# Altium footprint library hallglib.PcbLib: 92 footprints (part 6 of 6)
Each footprint in its own frame and in the unit in brackets; x right, y up, seen from the top. Pads: shape width x height; smd on the part's side, far side on the other; paste and mask are expansions set on the pad; w line width, h text height; cw(c..) or ccw(c..) is an arc to the next point about the centre after c.
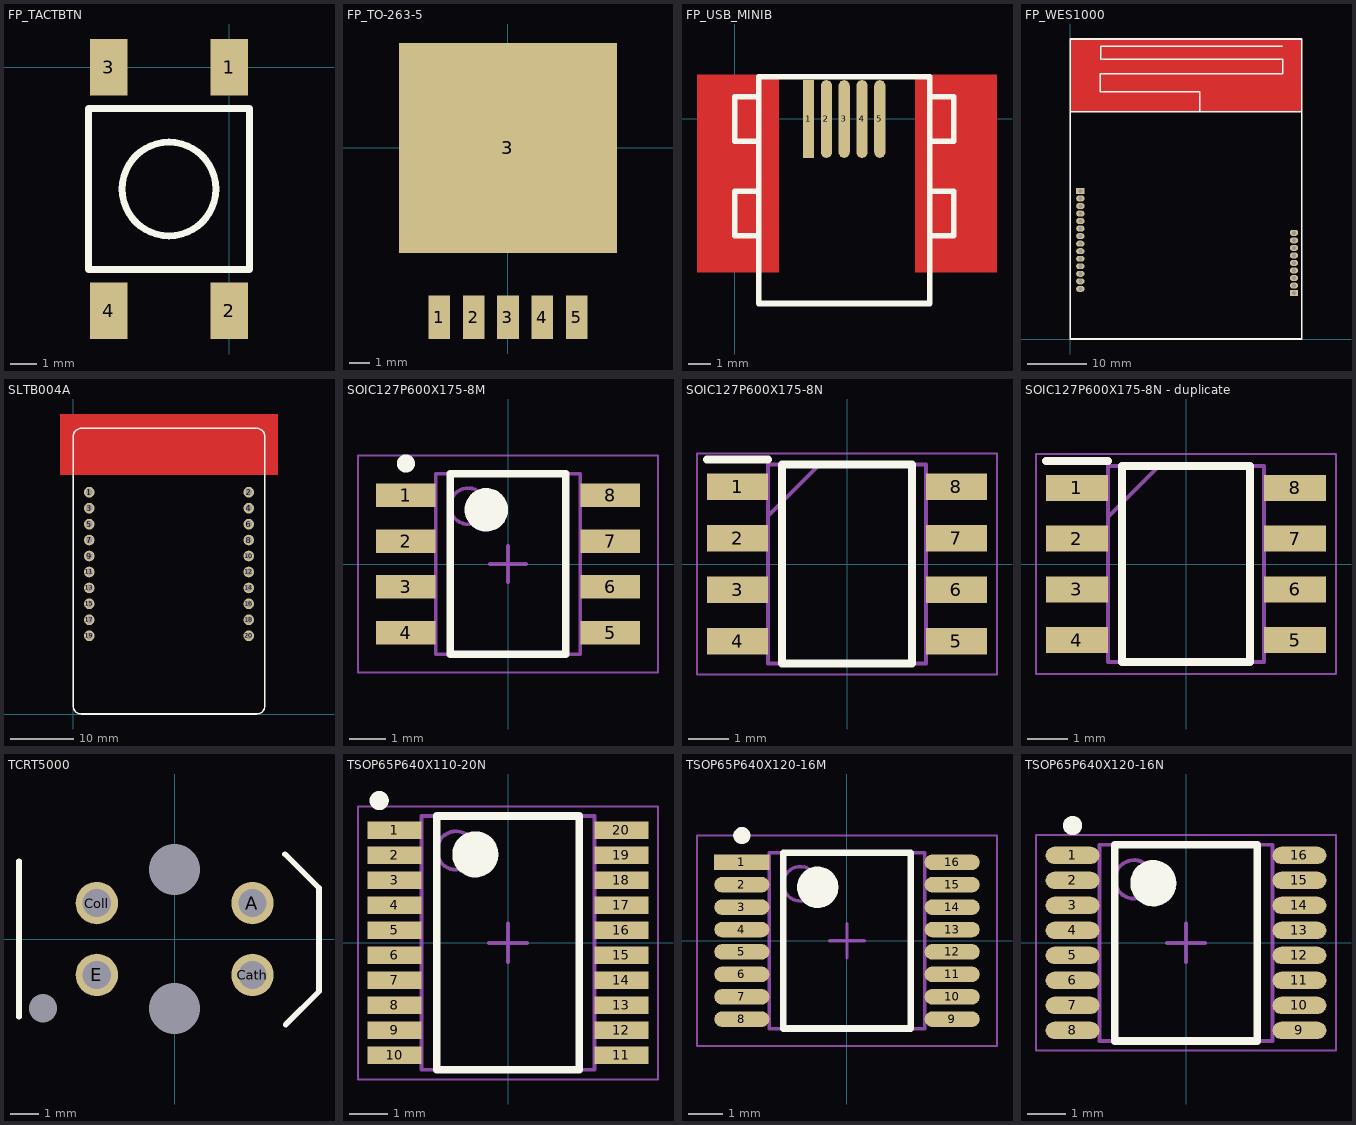
[diagram p5: the footprints below, top view; thin cyan lines are the x and y axes]

## FP_TACTBTN [mm] "TE CONNECTIVITY / ALCOSWITCH - FSM2JSMA"
height 4.44
pads (4):
  rect 1.4x2.1 smd: 1(0,0) 2(0,-9.1) 3(-4.5,0) 4(-4.5,-9.1)
Top Overlay:
  circle w0.254: c-2.25,-4.55 r1.75
  lines w0.254: -5.25,-7.55 0.75,-7.55 0.75,-1.55 -5.25,-1.55 -5.25,-7.55
3D body "TACT_SMD_6X6.STEP": height 5, standoff -0.05, extent -5.225,-8.575 0.775,-0.425

## FP_TO-263-5 [mm] "TO-263-5 footprint"
height 4.5
pads (6):
  rect 1.07x2.16 smd: 1(-3.4,-8.4) 2(-1.7,-8.4) 3(0,-8.4) 4(1.7,-8.4) 5(3.4,-8.4)
  rect 10.8x10.41 smd: 3(0,0)
3D body "TO-263-5.STEP": height 4.56, standoff 0, extent -5.08,-9.327 5.08,4.687

## FP_USB_MINIB [mm] "MINI USB csatlakozó"
height 3.9
pads (5):
  rect 0.5x3.5 smd: 1(3.325,0)
  oval 0.5x3.5 smd: 2(4.125,0) 3(4.925,0) 4(5.725,0) 5(6.525,0)
Top Layer:
  rectangle: 8.1,-6.9 11.8,2
  rectangle: -1.7,-6.9 2,2
Top Overlay:
  lines w0.254: 1.075,-5.25 0,-5.25 0,-3.25 1.075,-3.25 ; 1.075,-1 0,-1 0,1 1.075,1 ; 8.775,-5.25 9.85,-5.25 9.85,-3.25 8.775,-3.25 ; 8.775,-1 9.85,-1 9.85,1 8.775,1 ; 1.075,-8.3 8.775,-8.3 8.775,1.9 1.075,1.9 1.075,-8.3
Top Solder:
  rectangle: 8.8,-5.95 10.8,-2.45
  rectangle: 8.8,-1.75 10.8,1.75
  rectangle: -1,-6.05 1,-2.55
  rectangle: -1,-1.75 1,1.75
3D body "USBBMINI.STEP": height 4, standoff -0.05, extent 0.003,-8.335 9.903,0.665

## FP_WES1000 [mm]
height 2
pads (23):
  rect 1.4x1 hole 0.7 mask+0.1: 1(1.676,24.968) 15(37.719,7.747)
  oval 1.4x1 hole 0.7 mask+0.1: 2(1.676,23.698) 3(1.676,22.428) 4(1.676,21.158) 5(1.676,19.888) 6(1.676,18.618) 7(1.676,17.348) 8(1.676,16.078) 9(1.676,14.808) 10(1.676,13.538) 11(1.676,12.268) 12(1.676,10.998) 13(1.676,9.728) 14(1.676,8.458) 16(37.719,9.017) 17(37.719,10.287) 18(37.719,11.557) 19(37.719,12.827) 20(37.719,14.097) 21(37.719,15.367) 22(37.719,16.637) 23(37.719,17.907)
Top Layer:
  pour cut-out: 0,38.3 0,50.6 39,50.6 39,38.3
Bottom Layer:
  pour cut-out: 0,38.3 0,50.6 39,50.6 39,38.3
Top Overlay:
  lines w0.254: 0,38.3 39,38.3 ; 21.8,38.3 21.8,41.7 5,41.7 5,44.7 35.8,44.7 35.8,47.2 5.1,47.2 5.1,49.4 35.7,49.4 ; 0,0 39,0 39,50.6 0,50.6 0,0
Bottom Overlay:
  lines w0.2: 0.576,7.768 0.576,25.758 ; 2.776,7.768 2.776,25.758 ; 36.619,6.957 36.619,18.447 ; 38.819,6.957 38.819,18.447
3D body: height 2, standoff 0, extent -0.127,-0.127 39.127,50.727

## SLTB004A [mm] "Thunderboard Sense 2 module"
pads (20):
  round 1.7 hole 1.1: 1(2.54,35.306) 2(27.94,35.306) 3(2.54,32.766) 4(27.94,32.766) 5(2.54,30.226) 6(27.94,30.226) 7(2.54,27.686) 8(27.94,27.686) 9(2.54,25.146) 10(27.94,25.146) 11(2.54,22.606) 12(27.94,22.606) 13(2.54,20.066) 14(27.94,20.066) 15(2.54,17.526) 16(27.94,17.526) 17(2.54,14.986) 18(27.94,14.986) 19(2.54,12.446) 20(27.94,12.446)
Top Layer:
  pour cut-out: -2.032,38.1 -2.032,47.752 32.512,47.752 32.512,38.1
Bottom Layer:
  pour cut-out: -2.032,38.1 -2.032,47.752 32.512,47.752 32.512,38.1
Top Overlay:
  lines w0.254: 0,1.27 ccw(c1.27,1.27) 1.27,0 29.21,0 ccw(c29.21,1.27) 30.48,1.27 30.48,44.196 ccw(c29.21,44.196) 29.21,45.466 1.27,45.466 ccw(c1.27,44.196) 0,44.196 0,1.27
3D body: height 8.7, standoff 8.4, extent 0,0 30.5,45.5
3D body: height 8.4, standoff 0, extent 26.675,11.3 29.175,36.5
3D body: height 8.4, standoff 0, extent 1.275,11.3 3.775,36.5
3D body: height 0, standoff -3, extent 27.61,14.656 28.27,15.316
3D body: height 0, standoff -3, extent 27.61,12.116 28.27,12.776
3D body: height 0, standoff -3, extent 27.61,19.736 28.27,20.396
3D body: height 0, standoff -3, extent 27.61,17.196 28.27,17.856
3D body: height 0, standoff -3, extent 27.61,24.816 28.27,25.476
3D body: height 0, standoff -3, extent 27.61,22.276 28.27,22.936
3D body: height 0, standoff -3, extent 27.61,29.896 28.27,30.556
3D body: height 0, standoff -3, extent 27.61,27.356 28.27,28.016
3D body: height 0, standoff -3, extent 27.61,34.976 28.27,35.636
3D body: height 0, standoff -3, extent 27.61,32.436 28.27,33.096
3D body: height 0, standoff -3, extent 2.21,34.976 2.87,35.636
3D body: height 0, standoff -3, extent 2.21,32.436 2.87,33.096
3D body: height 0, standoff -3, extent 2.21,29.896 2.87,30.556
3D body: height 0, standoff -3, extent 2.21,27.356 2.87,28.016
3D body: height 0, standoff -3, extent 2.21,24.816 2.87,25.476
3D body: height 0, standoff -3, extent 2.21,22.276 2.87,22.936
3D body: height 0, standoff -3, extent 2.21,19.736 2.87,20.396
3D body: height 0, standoff -3, extent 2.21,17.196 2.87,17.856
3D body: height 0, standoff -3, extent 2.21,14.656 2.87,15.316
3D body: height 0, standoff -3, extent 2.21,12.116 2.87,12.776

## SOIC127P600X175-8M [mm] "SOIC, 8-Leads, Body 4,90x3,90mm, Pitch 1,27mm, IPC Low Density"
height 1.75
pads (8):
  rect 1.65x0.65 smd: 1(-2.825,1.905) 2(-2.825,0.635) 3(-2.825,-0.635) 4(-2.825,-1.905) 5(2.825,-1.905) 6(2.825,-0.635) 7(2.825,0.635) 8(2.825,1.905)
Top Overlay:
  circle w0.6: c-0.6,1.5 r0.3
  circle w0.25: c-2.825,2.78 r0.125
  lines w0.2: -1.6,-2.5 1.6,-2.5 1.6,2.5 -1.6,2.5 -1.6,-2.5
Mechanical 13:
  circle w0.1: c-1.1,1.6 r0.5
  lines w0.1: -2,-2.5 2,-2.5 2,2.5 -2,2.5 -2,-2.5
Mechanical 15:
  lines w0.05: -4.15,-3 4.15,-3 4.15,3 -4.15,3 -4.15,-3
  lines w0.1: -0.5,0 0.5,0 ; 0,-0.5 0,0.5
3D body "SOIC127P600X175-8M.step": height 1.75, standoff 0, extent -3,-2.5 3,2.5

## SOIC127P600X175-8N [mm]
pads (8):
  rect 1.5x0.65 smd: 1(-2.7,1.905) 2(-2.7,0.635) 3(-2.7,-0.635) 4(-2.7,-1.905) 5(2.7,-1.905) 6(2.7,-0.635) 7(2.7,0.635) 8(2.7,1.905)
Top Overlay:
  lines w0.2: -3.45,2.58 -1.95,2.58 ; -1.6,-2.45 1.6,-2.45 1.6,2.45 -1.6,2.45 -1.6,-2.45
Mechanical 15:
  lines w0.1: -1.95,1.18 -0.68,2.45 ; -1.95,-2.45 1.95,-2.45 1.95,2.45 -1.95,2.45 -1.95,-2.45
Bottom Assembly:
  lines w0.05: -3.7,-2.725 3.7,-2.725 3.7,2.725 -3.7,2.725 -3.7,-2.725

## SOIC127P600X175-8N - duplicate [mm]
pads (8):
  rect 1.55x0.65 smd: 1(-2.725,1.905) 2(-2.725,0.635) 3(-2.725,-0.635) 4(-2.725,-1.905) 5(2.725,-1.905) 6(2.725,-0.635) 7(2.725,0.635) 8(2.725,1.905)
Top Overlay:
  lines w0.2: -3.5,2.58 -1.95,2.58 ; -1.6,-2.45 1.6,-2.45 1.6,2.45 -1.6,2.45 -1.6,-2.45
Mechanical 15:
  lines w0.1: -1.95,1.18 -0.68,2.45 ; -1.95,-2.45 1.95,-2.45 1.95,2.45 -1.95,2.45 -1.95,-2.45
Bottom Assembly:
  lines w0.05: -3.75,-2.75 3.75,-2.75 3.75,2.75 -3.75,2.75 -3.75,-2.75

## TCRT5000 [mm]
pads (7):
  round 0 hole 1 unplated: 0(-4.65,-2.45)
  round 0 hole 1.8 unplated: 0(0,-2.45) 0(0,2.45)
  round 1.5 hole 1: A(2.75,1.27) Cath(2.75,-1.27) Coll(-2.75,1.27) E(-2.75,-1.27)
Top Overlay:
  lines w0.2: -5.5,-2.75 -5.5,2.75 ; 3.9,3 5.1,1.8 5.1,-1.85 3.925,-3.025
3D body "80154_TCRT5000_3D_Models.stp": height 7.01, standoff -3.07, extent -5.08,-3.454 5.12,3.454

## TSOP65P640X110-20N [mm] "TSOP, 20-Leads, Body 6,50x4,40mm, Pitch 0,65mm, IPC Medium Density"
height 1.1
pads (20):
  rect 1.4x0.45 smd: 1(-2.95,2.925) 2(-2.95,2.275) 3(-2.95,1.625) 4(-2.95,0.975) 5(-2.95,0.325) 6(-2.95,-0.325) 7(-2.95,-0.975) 8(-2.95,-1.625) 9(-2.95,-2.275) 10(-2.95,-2.925) 11(2.95,-2.925) 12(2.95,-2.275) 13(2.95,-1.625) 14(2.95,-0.975) 15(2.95,-0.325) 16(2.95,0.325) 17(2.95,0.975) 18(2.95,1.625) 19(2.95,2.275) 20(2.95,2.925)
Top Overlay:
  circle w0.25: c-3.35,3.7 r0.125
  circle w0.6: c-0.85,2.3 r0.3
  lines w0.2: -1.85,-3.3 -1.85,3.3 1.85,3.3 1.85,-3.3 -1.85,-3.3
Mechanical 13:
  circle w0.1: c-1.35,2.4 r0.5
  lines w0.1: -2.25,-3.3 -2.25,3.3 2.25,3.3 2.25,-3.3 -2.25,-3.3
Mechanical 15:
  lines w0.05: -3.9,-3.55 -3.9,3.55 3.9,3.55 3.9,-3.55 -3.9,-3.55
  lines w0.1: -0.5,0 0.5,0 ; 0,-0.5 0,0.5
3D body "TSOP65P640X110-20N.step": height 1.1, standoff 0, extent -3.2,-3.3 3.2,3.3

## TSOP65P640X120-16M [mm] "TSOP, 16-Leads, Body 5,00x4,40mm, Pitch 0,65mm, IPC Low Density"
height 1.2
pads (16):
  rect 1.6x0.45 smd: 1(-3.05,2.275)
  oval 1.6x0.45 smd: 2(-3.05,1.625) 3(-3.05,0.975) 4(-3.05,0.325) 5(-3.05,-0.325) 6(-3.05,-0.975) 7(-3.05,-1.625) 8(-3.05,-2.275) 9(3.05,-2.275) 10(3.05,-1.625) 11(3.05,-0.975) 12(3.05,-0.325) 13(3.05,0.325) 14(3.05,0.975) 15(3.05,1.625) 16(3.05,2.275)
Top Overlay:
  circle w0.6: c-0.85,1.55 r0.3
  circle w0.25: c-3.05,3.05 r0.125
  lines w0.2: -1.85,-2.55 1.85,-2.55 1.85,2.55 -1.85,2.55 -1.85,-2.55
Mechanical 13:
  circle w0.1: c-1.35,1.65 r0.5
  lines w0.1: -2.25,-2.55 2.25,-2.55 2.25,2.55 -2.25,2.55 -2.25,-2.55
Mechanical 15:
  lines w0.05: -4.35,-3.05 4.35,-3.05 4.35,3.05 -4.35,3.05 -4.35,-3.05
  lines w0.1: -0.5,0 0.5,0 ; 0,-0.5 0,0.5
3D body: height 1.2, standoff 0.15, extent -2.25,-2.55 2.25,2.55

## TSOP65P640X120-16N [mm] "TSOP, 16-Leads, Body 5,00x4,40mm, Pitch 0,65mm, IPC Medium Density"
height 1.2
pads (16):
  oval 1.4x0.45 smd: 1(-2.95,2.275) 2(-2.95,1.625) 3(-2.95,0.975) 4(-2.95,0.325) 5(-2.95,-0.325) 6(-2.95,-0.975) 7(-2.95,-1.625) 8(-2.95,-2.275) 9(2.95,-2.275) 10(2.95,-1.625) 11(2.95,-0.975) 12(2.95,-0.325) 13(2.95,0.325) 14(2.95,0.975) 15(2.95,1.625) 16(2.95,2.275)
Top Overlay:
  circle w0.6: c-0.85,1.55 r0.3
  circle w0.25: c-2.95,3.05 r0.125
  lines w0.2: -1.85,-2.55 1.85,-2.55 1.85,2.55 -1.85,2.55 -1.85,-2.55
Mechanical 13:
  circle w0.1: c-1.35,1.65 r0.5
  lines w0.1: -2.25,-2.55 2.25,-2.55 2.25,2.55 -2.25,2.55 -2.25,-2.55
Mechanical 15:
  lines w0.05: -3.9,-2.8 3.9,-2.8 3.9,2.8 -3.9,2.8 -3.9,-2.8
  lines w0.1: -0.5,0 0.5,0 ; 0,-0.5 0,0.5
3D body "TSOP65P640X120-16N.step": height 1.2, standoff 0, extent -3.2,-2.55 3.2,2.55